# Altium footprint library Indruino.PcbLib: 383 footprints (part 6 of 24)
Each footprint in its own frame and in the unit in brackets; x right, y up, seen from the top. Pads: shape width x height; smd on the part's side, far side on the other; paste and mask are expansions set on the pad; w line width, h text height; cw(c..) or ccw(c..) is an arc to the next point about the centre after c.
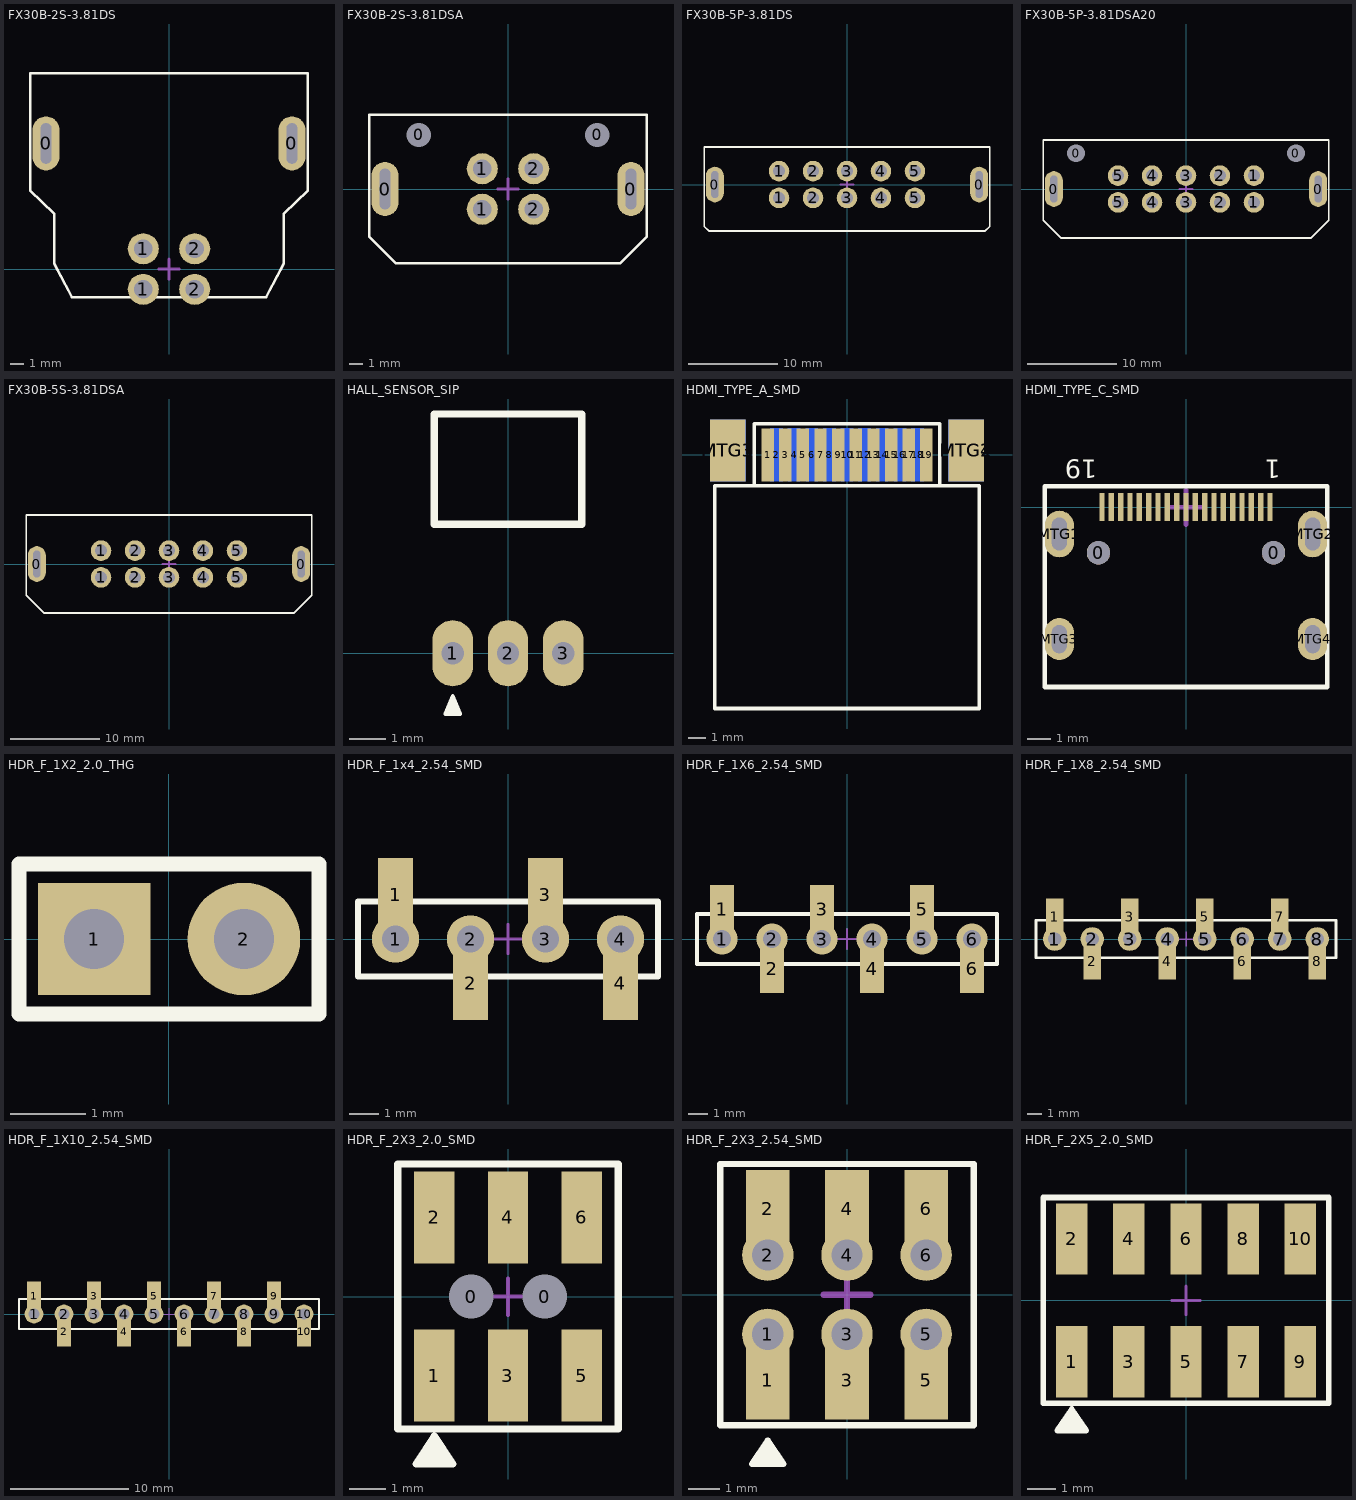
[diagram p5: the footprints below, top view; thin cyan lines are the x and y axes]

## FX30B-2S-3.81DS [mm]
pads (6):
  oval 2x4 hole 0.8 slot 3 at 90 deg: 0(-9.105,9.3) 0(9.105,9.3)
  round 2.3 hole 1.35: 1(-1.905,-1.5) 1(-1.905,1.5) 2(1.905,-1.5) 2(1.905,1.5)
Top Overlay:
  lines w0.2: -10.28,5.8 -10.28,14.5 10.28,14.5 10.28,5.8 8.5,4.1 8.5,0.4 7.18,-2.1 -7.18,-2.1 -8.5,0.4 -8.5,4.1 -10.28,5.8
Mechanical 15:
  lines w0.2: -0.75,0 0.75,0 ; 0,-0.75 0,0.75
3D body "FX30B-2S-3.81DS.stp": height 11.52, standoff -2.78, extent -10.28,-2.1 10.28,14.5

## FX30B-2S-3.81DSA [mm]
pads (8):
  oval 2x4 hole 0.8 slot 3 at 90 deg: 0(-9.105,0) 0(9.105,0)
  round 1.5 hole 1.8: 0(-6.605,4) 0(6.605,4)
  round 2.3 hole 1.35: 1(-1.905,-1.5) 1(-1.905,1.5) 2(1.905,-1.5) 2(1.905,1.5)
Top Overlay:
  lines w0.2: -10.28,-3.52 -8.3,-5.5 8.3,-5.5 10.28,-3.52 10.28,5.5 -10.28,5.5 -10.28,-3.52
Mechanical 15:
  lines w0.2: -0.75,0 0.75,0 ; 0,-0.75 0,0.75
3D body "FX30B-2S-3.81DSA.stp": height 16.32, standoff -3.28, extent -10.28,-5.5 10.28,5.5

## FX30B-5P-3.81DS [mm]
pads (12):
  oval 2x4 hole 0.8 slot 3 at 90 deg: 0(-14.82,0) 0(14.82,0)
  round 2.3 hole 1.35: 1(-7.62,-1.5) 1(-7.62,1.5) 2(-3.81,-1.5) 2(-3.81,1.5) 3(0,-1.5) 3(0,1.5) 4(3.81,-1.5) 4(3.81,1.5) 5(7.62,-1.5) 5(7.62,1.5)
Top Overlay:
  lines w0.2: -15.995,-4.705 -15.5,-5.2 15.5,-5.2 15.995,-4.705 15.995,4.2 -15.995,4.2 -15.995,-4.705
Mechanical 15:
  lines w0.2: -0.75,0 0.75,0 ; 0,-0.75 0,0.75
3D body "FX30B-5P-3.81DS.stp": height 11.52, standoff -2.78, extent -15.995,-16 15.995,4.2

## FX30B-5P-3.81DSA20 [mm]
pads (14):
  oval 2x4 hole 0.8 slot 3 at 90 deg: 0(-14.82,0) 0(14.82,0)
  round 1.8 hole 2: 0(-12.32,4) 0(12.32,4)
  round 2.3 hole 1.35: 1(7.62,-1.5) 1(7.62,1.5) 2(3.81,-1.5) 2(3.81,1.5) 3(0,-1.5) 3(0,1.5) 4(-3.81,-1.5) 4(-3.81,1.5) 5(-7.62,-1.5) 5(-7.62,1.5)
Top Overlay:
  lines w0.2: -15.995,-3.505 -15.995,5.5 15.995,5.5 15.995,-3.505 14,-5.5 -14,-5.5 -15.995,-3.505
Mechanical 15:
  lines w0.2: -0.75,0 0.75,0 ; 0,-0.75 0,0.75
3D body "FX30B-5P-3.81DSA20.stp": height 14.23, standoff -3.27, extent -15.995,-5.5 15.995,5.5

## FX30B-5S-3.81DSA [mm]
pads (12):
  oval 2x4 hole 0.8 slot 3 at 90 deg: 0(-14.82,0) 0(14.82,0)
  round 2.3 hole 1.35: 1(-7.62,-1.5) 1(-7.62,1.5) 2(-3.81,-1.5) 2(-3.81,1.5) 3(0,-1.5) 3(0,1.5) 4(3.81,-1.5) 4(3.81,1.5) 5(7.62,-1.5) 5(7.62,1.5)
Top Overlay:
  lines w0.2: -15.995,-3.505 -14,-5.5 14,-5.5 15.995,-3.505 15.995,5.5 -15.995,5.5 -15.995,-3.505
Mechanical 15:
  lines w0.2: -0.75,0 0.75,0 ; 0,-0.75 0,0.75
3D body "FX30B-5S-3.81DSA.stp": height 16.32, standoff -3.28, extent -15.995,-5.5 15.995,5.5

## HALL_SENSOR_SIP [mm] "SIP; 3 Leads; Body 3 x 4 x 1.5 mm (typ); Pitch 1.27 mm"
height 5.2
pads (3):
  oval 1.1x1.8 hole 0.6: 1(-1.5,0) 2(0,0) 3(1.5,0)
Top Overlay:
  region: -1.7,-1.65 -1.5,-1.15 -1.3,-1.65
  lines w0.1: -1.7,-1.65 -1.5,-1.15 -1.3,-1.65 -1.7,-1.65
  lines w0.2: -2,3.5 2,3.5 2,6.5 -2,6.5 -2,3.5
3D body "CircuitWorks-HALL SENSOR DIP.step": height 1.14, standoff -0.36, extent -2.05,-0.15 2.05,6.5

## HDMI_TYPE_A_SMD [mm]
pads (23):
  rect 0.7x3 smd: 1(-4.5,0) 3(-3.5,0) 5(-2.5,0) 7(-1.5,0) 9(-0.5,0) 11(0.5,0) 13(1.5,0) 15(2.5,0) 17(3.5,0) 19(4.5,0)
  rect 0.7x3 smd far side: 2(-4,0) 4(-3,0) 6(-2,0) 8(-1,0) 10(0,0) 12(1,0) 14(2,0) 16(3,0) 18(4,0)
  rect 2x3.5 smd: MTG1(-6.75,0.25) MTG2(6.75,0.25)
  rect 2x3.5 smd far side: MTG3(-6.75,0.25) MTG4(6.75,0.25)
Top Overlay:
  lines w0.2: -7.5,-14.375 -7.5,-1.75 7.5,-1.75 7.5,-14.375 -7.5,-14.375 ; -5.25,-1.75 -5.25,1.75 5.25,1.75 5.25,-1.75 -5.25,-1.75
Mechanical 15:
  lines w0.2: -0.75,0 0.75,0 ; 0,-0.75 0,0.75
3D body "User Library-3067-20010002R-Rev_01.step": height 1.67, standoff -3.27, extent -7.45,-14.3 7.45,3

## HDMI_TYPE_C_SMD [mm]
pads (25):
  round 1 hole 1: 0(-3.75,-1.95) 0(3.75,-1.95)
  rect 0.23x1.2 smd: 1(3.6,0) 2(3.2,0) 3(2.8,0) 4(2.4,0) 5(2,0) 6(1.6,0) 7(1.2,0) 8(0.8,0) 9(0.4,0) 10(0,0) 11(-0.4,0) 12(-0.8,0) 13(-1.2,0) 14(-1.6,0) 15(-2,0) 16(-2.4,0) 17(-2.8,0) 18(-3.2,0) 19(-3.6,0)
  oval 1.25x2 hole 0.65 slot 1.4 at 90 deg: MTG1(-5.425,-1.15) MTG2(5.425,-1.15)
  oval 1.25x1.8 hole 0.65 slot 1.2 at 90 deg: MTG3(-5.425,-5.65) MTG4(5.425,-5.65)
Top Overlay:
  lines w0.2: -6.05,-7.7 -6.05,0.9 6.05,0.9 6.05,-7.7 1.652,-7.7 -6.05,-7.7
  text "1" at 4.064,2.032 h0.8
  text "19" at -3.81,2.032 h0.8
Mechanical 15:
  lines w0.2: -0.75,0 0.75,0 ; 0,-0.75 0,0.75
3D body "2001-1-2-21-00-BK1_2.STEP": height 3.33, standoff -0.97, extent -5.6,-7.7 5.6,0.3

## HDR_F_1X2_2.0_THG [mm]
pads (2):
  rect 1.5x1.5 hole 0.8: 1(-1,0)
  round 1.5 hole 0.8: 2(1,0)
Top Overlay:
  lines w0.2: 2,-1 0.5,-1 -2,-1 -2,1 0,1 2,1 ; 2,-1 2,-1 ; 2,-1 2,1 ; 2,1 2,1
3D body "User Library-PBS2-2.STEP": height 4.3, standoff -3.15, extent -2,-1 2,1

## HDR_F_1x4_2.54_SMD [mm]
pads (8):
  round 1.6 hole 0.9: 1(-3.81,0) 2(-1.27,0) 3(1.27,0) 4(3.81,0)
  rect 1.2x2.5 smd: 1(-3.81,1.5) 2(-1.27,-1.5) 3(1.27,1.5) 4(3.81,-1.5)
Top Overlay:
  lines w0.2: -4.445,1.27 -5.08,1.27 -5.08,-1.27 -1.905,-1.27 ; -3.175,1.27 0.635,1.27 ; -0.635,-1.27 3.175,-1.27 ; 1.905,1.27 5.08,1.27 5.08,-1.27 4.445,-1.27
Mechanical 15:
  lines w0.1: -0.5,0 0.5,0 ; 0,-0.5 0,0.5
3D body "C041KFXC-RC.STEP": height 7.55, standoff 0.05, extent -5.08,-2.14 5.08,2.16

## HDR_F_1X6_2.54_SMD [mm]
pads (12):
  round 1.6 hole 0.9: 1(-6.35,0) 2(-3.81,0) 3(-1.27,0) 4(1.27,0) 5(3.81,0) 6(6.35,0)
  rect 1.2x2.5 smd: 1(-6.35,1.5) 2(-3.81,-1.5) 3(-1.27,1.5) 4(1.27,-1.5) 5(3.81,1.5) 6(6.35,-1.5)
Top Overlay:
  lines w0.2: -6.985,1.27 -7.62,1.27 -7.62,-1.27 -4.445,-1.27 ; -5.715,1.27 -1.905,1.27 ; -3.175,-1.27 0.635,-1.27 ; -0.635,1.27 3.175,1.27 ; 1.905,-1.27 5.715,-1.27 ; 4.445,1.27 7.62,1.27 7.62,-1.27 6.985,-1.27
Mechanical 15:
  lines w0.1: -0.5,0 0.5,0 ; 0,-0.5 0,0.5
3D body "C061KFXC-RC.STEP": height 7.55, standoff 0.05, extent -7.62,-2.14 7.62,2.16

## HDR_F_1X8_2.54_SMD [mm]
pads (16):
  round 1.6 hole 0.9: 1(-8.89,0) 2(-6.35,0) 3(-3.81,0) 4(-1.27,0) 5(1.27,0) 6(3.81,0) 7(6.35,0) 8(8.89,0)
  rect 1.2x2.5 smd: 1(-8.89,1.5) 2(-6.35,-1.5) 3(-3.81,1.5) 4(-1.27,-1.5) 5(1.27,1.5) 6(3.81,-1.5) 7(6.35,1.5) 8(8.89,-1.5)
Top Overlay:
  lines w0.2: -9.525,1.27 -10.16,1.27 -10.16,-1.27 -6.985,-1.27 ; -8.255,1.27 -4.445,1.27 ; -5.715,-1.27 -1.905,-1.27 ; -3.175,1.27 0.635,1.27 ; -0.635,-1.27 3.175,-1.27 ; 1.905,1.27 5.715,1.27 ; 4.445,-1.27 8.255,-1.27 ; 6.985,1.27 10.16,1.27 10.16,-1.27 9.525,-1.27
Mechanical 15:
  lines w0.1: -0.5,0 0.5,0 ; 0,-0.5 0,0.5
3D body "C081KFXC-RC.STEP": height 7.55, standoff 0.05, extent -10.16,-2.14 10.16,2.16

## HDR_F_1X10_2.54_SMD [mm]
pads (20):
  round 1.6 hole 0.9: 1(-11.43,0) 2(-8.89,0) 3(-6.35,0) 4(-3.81,0) 5(-1.27,0) 6(1.27,0) 7(3.81,0) 8(6.35,0) 9(8.89,0) 10(11.43,0)
  rect 1.2x2.5 smd: 1(-11.43,1.5) 2(-8.89,-1.5) 3(-6.35,1.5) 4(-3.81,-1.5) 5(-1.27,1.5) 6(1.27,-1.5) 7(3.81,1.5) 8(6.35,-1.5) 9(8.89,1.5) 10(11.43,-1.5)
Top Overlay:
  lines w0.2: -12.065,1.27 -12.7,1.27 -12.7,-1.27 -9.525,-1.27 ; -10.795,1.27 -6.985,1.27 ; -8.255,-1.27 -4.445,-1.27 ; -5.715,1.27 -1.905,1.27 ; -3.175,-1.27 0.635,-1.27 ; -0.635,1.27 3.175,1.27 ; 1.905,-1.27 5.715,-1.27 ; 4.445,1.27 8.255,1.27 ; 6.985,-1.27 10.795,-1.27 ; 9.525,1.27 12.7,1.27 12.7,-1.27 12.065,-1.27
Mechanical 15:
  lines w0.1: -0.5,0 0.5,0 ; 0,-0.5 0,0.5
3D body "C101KFXC-RC.STEP": height 7.55, standoff 0.05, extent -12.7,-2.14 12.7,2.16

## HDR_F_2X3_2.0_SMD [mm]
pads (8):
  round 1 hole 1.2: 0(-1,0) 0(1,0)
  rect 1.1x2.5 smd: 1(-2,-2.15) 2(-2,2.15) 3(0,-2.15) 4(0,2.15) 5(2,-2.15) 6(2,2.15)
Top Overlay:
  region: -2.5,-4.55 -1.5,-4.55 -2,-3.8
  lines w0.2: -3,-3.6 3,-3.6 3,3.6 -3,3.6 -3,-3.6 ; -2.5,-4.55 -1.5,-4.55 -2,-3.8 -2.5,-4.55
Mechanical 15:
  lines w0.1: -0.5,0 0.5,0 ; 0,-0.5 0,0.5
3D body "A3A-6DA-2SV.stp": height 4.2, standoff -1.1, extent -3,-3 3,3

## HDR_F_2X3_2.54_SMD [mm]
pads (12):
  rect 1.4x2.5 smd: 1(-2.54,-2.75) 2(-2.54,2.75) 3(0,-2.75) 4(0,2.75) 5(2.54,-2.75) 6(2.54,2.75)
  round 1.65 hole 1: 1(-2.54,-1.27) 2(-2.54,1.27) 3(0,-1.27) 4(0,1.27) 5(2.54,-1.27) 6(2.54,1.27)
Top Overlay:
  region: -3.04,-5.43 -2.04,-5.43 -2.54,-4.68
  lines w0.2: -4.064,-4.191 4.064,-4.191 4.064,4.191 -4.064,4.191 -4.064,-4.191 ; -3.04,-5.43 -2.54,-4.68 -2.04,-5.43 -3.04,-5.43
Mechanical 15:
  lines w0.2: -0.75,0 0.75,0 ; 0,-0.75 0,0.75
3D body "C032KFMS-RC.STEP": height 7.5, standoff 0, extent -4.06,-3.421 4.06,3.425

## HDR_F_2X5_2.0_SMD [mm]
pads (10):
  rect 1.1x2.5 smd: 1(-4,-2.15) 2(-4,2.15) 3(-2,-2.15) 4(-2,2.15) 5(0,-2.15) 6(0,2.15) 7(2,-2.15) 8(2,2.15) 9(4,-2.15) 10(4,2.15)
Top Overlay:
  region: -4.5,-4.55 -3.5,-4.55 -4,-3.8
  lines w0.2: -5,-3.6 -5,3.6 5,3.6 5,-3.6 -5,-3.6 ; -4.5,-4.55 -4,-3.8 -3.5,-4.55 -4.5,-4.55
Mechanical 15:
  lines w0.1: -0.5,0 0.5,0 ; 0,-0.5 0,0.5
3D body "A3A-10DA-2SV.stp": height 4.2, standoff -1.1, extent -5,-3 5,3